# Altium footprint library CMR_Miscellaneous_Devices.PcbLib: 103 footprints (part 5 of 7)
Each footprint in its own frame and in the unit in brackets; x right, y up, seen from the top. Pads: shape width x height; smd on the part's side, far side on the other; paste and mask are expansions set on the pad; w line width, h text height; cw(c..) or ccw(c..) is an arc to the next point about the centre after c.
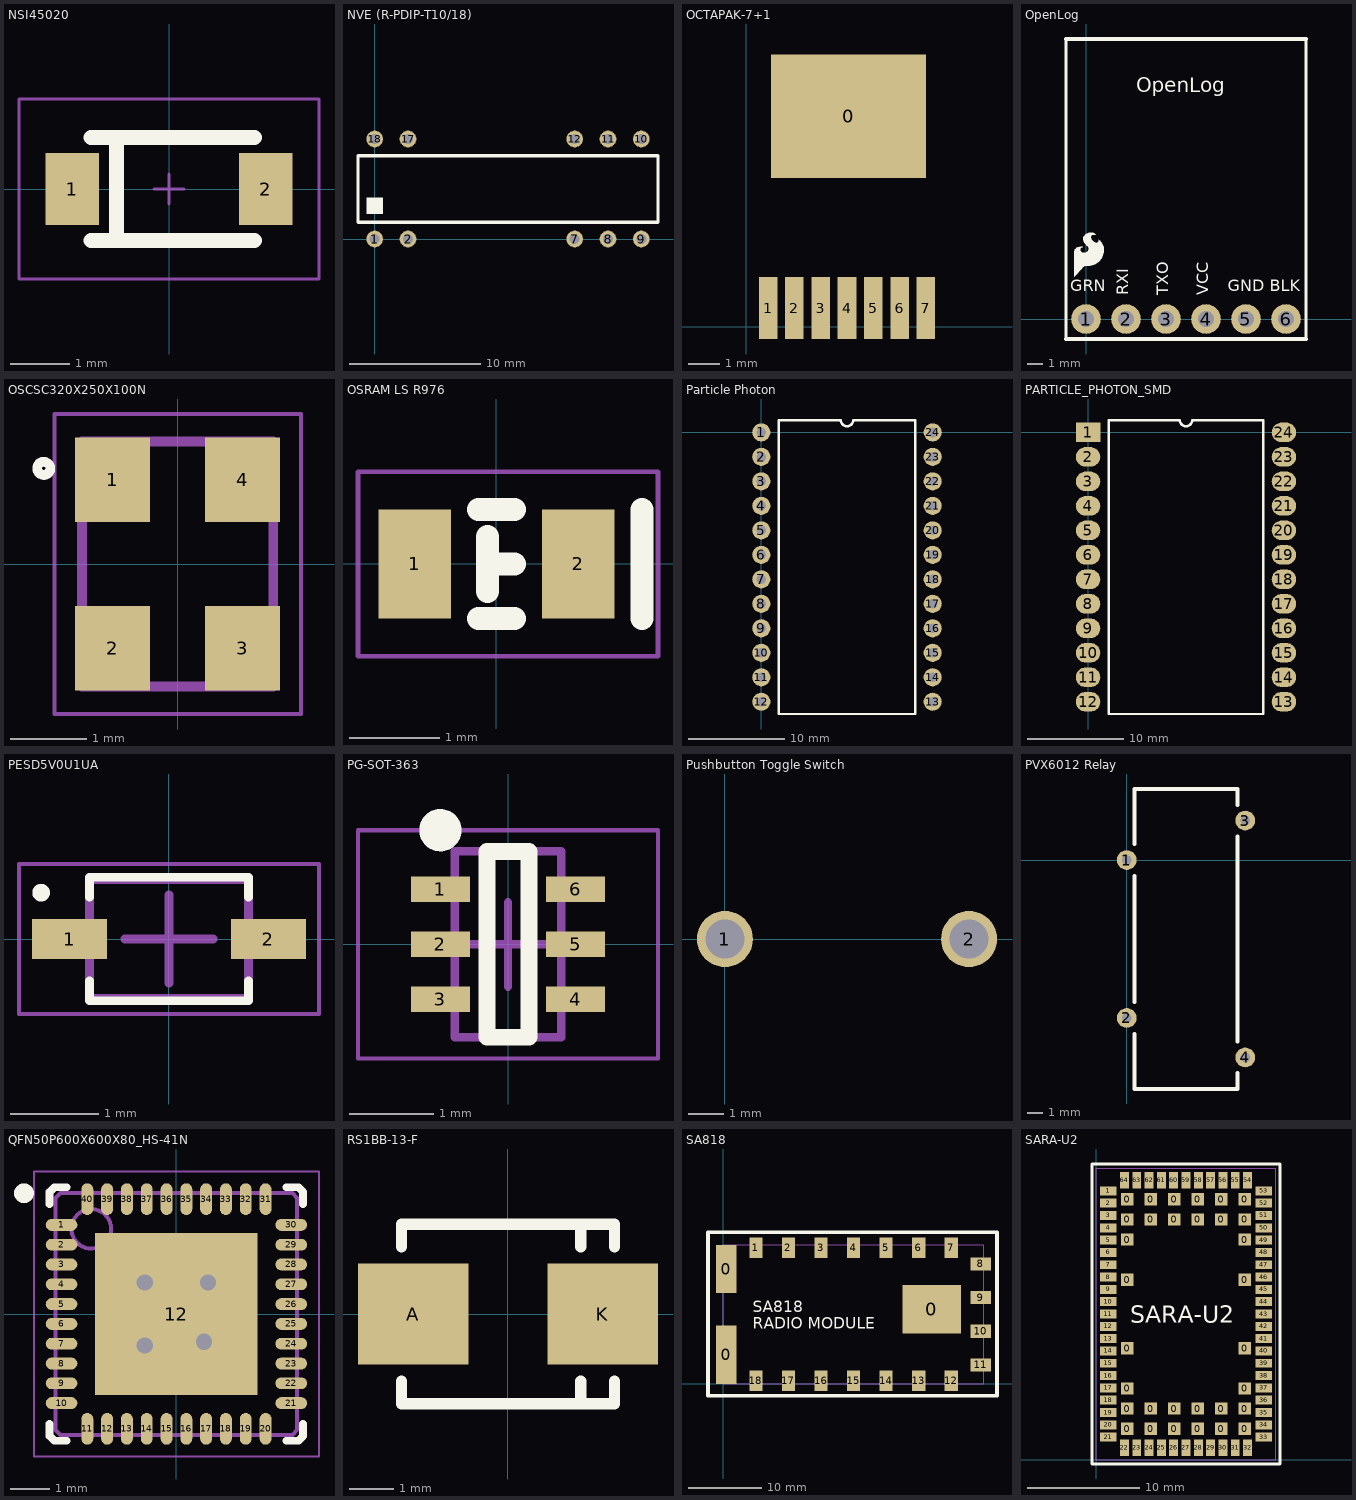
[diagram p4: the footprints below, top view; thin cyan lines are the x and y axes]

## NSI45020 [mm] "SOD-123 Package Constant Current Regulator, 20mA"
pads (2):
  rect 0.91x1.22 smd: 1(-1.637,0) 2(1.637,0)
Top Overlay:
  lines w0.254: -1.325,-0.875 1.45,-0.875 ; -1.325,0.875 1.45,0.875 ; -0.889,-0.875 -0.889,0.875
Mechanical 15:
  lines w0.051: -0.25,0 0.25,0 ; 0,-0.25 0,0.25 ; -2.54,-1.524 0.254,-1.524 2.54,-1.524 2.54,1.524 -2.54,1.524 -2.54,-1.524
3D body "SW3DPS-SOD123-DEFAULT.STEP": height 1.3, standoff 0.03, extent -1.85,-0.8 1.85,0.8

## NVE (R-PDIP-T10/18) [mil]
pads (10):
  round 50 hole 30: 1(0,0) 2(100,0) 7(600,0) 8(700,0) 9(800,0) 10(800,300) 11(700,300) 12(600,300) 17(100,300) 18(0,300)
Top Overlay:
  rectangle: -25,75 25,125
  lines w10: -50,50 850,50 850,250 625,250 175,250 -50,250 -50,125 -50,50

## OCTAPAK-7+1 [mm]
pads (8):
  rect 5x4 smd: 0(3.3,6.8)
  rect 0.6x2 smd: 1(0.7,0.6) 2(1.55,0.6) 3(2.4,0.6) 4(3.25,0.6) 5(4.1,0.6) 6(4.95,0.6) 7(5.8,0.6)
3D body: height 0.25, standoff 0, extent 5.55,0 6.05,2.8
3D body: height 0.25, standoff 0, extent 4.7,0 5.2,2.8
3D body: height 0.25, standoff 0, extent 3.85,0 4.35,2.8
3D body: height 0.25, standoff 0, extent 3,0 3.5,2.8
3D body: height 0.25, standoff 0, extent 2.15,0 2.65,2.8
3D body: height 0.25, standoff 0, extent 1.3,0 1.8,2.8
3D body: height 0.25, standoff 0, extent 0.45,0 0.95,2.8
3D body: height 0.25, standoff 0, extent 0,2.8 6.5,9.7

## OpenLog [mil] "Openlog serial data logger"
pads (6):
  round 74 hole 40: 1(0,0) 2(100,0) 3(200,0) 4(300,0) 5(400,0) 6(500,0)
Top Overlay:
  drawing of 5 lines, arcs and shapes, not listed
  text "OpenLog" at 125,555 h62
  text "GRN" at -40,60 h49.6
  text "TXO" at 215,60 h49.6
  text "RXI" at 115,60 h49.6
  text "VCC" at 315,60 h49.6
  text "GND" at 355,60 h49.6
  text "BLK" at 460,60 h49.6
3D body "Pin Header 1x4 TH Pitch 2.54mm.stp": height 373.85, standoff -125.98, extent 150,-50 550,50
3D body "Pin Header 1x4 TH Pitch 2.54mm.stp": height 373.85, standoff -125.98, extent -50,-50 350,50
3D body "OpenLog.step": height 175, standoff 112.39, extent -50,-50 550,700

## OSCSC320X250X100N [mm]
pads (4):
  rect 0.98x1.1 smd: 1(-0.85,1.1) 2(-0.85,-1.1) 3(0.85,-1.1) 4(0.85,1.1)
Top Overlay:
  circle w0.127: c-1.75,1.25 r0.086
Mechanical 1:
  lines w0.127: -1.25,-1.6 1.25,-1.6 1.25,1.6 -1.25,1.6 -1.25,-1.6
Mechanical 4:
  lines w0.05: -1.61,-1.96 1.61,-1.96 1.61,1.96 -1.61,1.96 -1.61,-1.96
3D body "ABM8G.STEP": height 0.99, standoff 0, extent -1.245,-1.6 1.245,1.6

## OSRAM LS R976 [mm] "OSRAM CHIPLED 0805 RED"
pads (2):
  rect 0.8x1.2 smd: 1(-0.9,0) 2(0.9,0)
Top Overlay:
  lines w0.254: -0.2,-0.6 0.2,-0.6 ; -0.2,0.6 0.2,0.6 ; -0.1,-0.3 -0.1,0.3 ; -0.1,0 0.2,0 ; 1.6,-0.6 1.6,0.6
Mechanical 15:
  lines w0.051: -1.524,-1.016 -1.524,0.254 -1.524,1.016 0.254,1.016 1.778,1.016 1.778,-1.016 0.508,-1.016 -1.524,-1.016
3D body "AP2012.STEP": height 1.09, standoff -0.01, extent -1,-0.625 1,0.625

## Particle Photon [mil]
pads (24):
  round 74 hole 40: 1(0,0) 2(0,-100) 3(0,-200) 4(0,-300) 5(0,-400) 6(0,-500) 7(0,-600) 8(0,-700) 9(0,-800) 10(0,-900) 11(0,-1000) 12(0,-1100) 13(700,-1100) 14(700,-1000) 15(700,-900) 16(700,-800) 17(700,-700) 18(700,-600) 19(700,-500) 20(700,-400) 21(700,-300) 22(700,-200) 23(700,-100) 24(700,0)
Top Overlay:
  lines w10: 72,-1150 628,-1150 628,50 375,50 cw(c350,50) 325,50 72,50 72,-1150
3D body "Particle Photon.stp": height 328.74, standoff -192.46, extent -59.04,-1271.62 740.98,211.39

## PARTICLE_PHOTON_SMD [mil]
pads (24):
  rect 100x80 smd: 1(0,0)
  oval 100x80 smd: 2(0,-100) 3(0,-200) 4(0,-300) 5(0,-400) 6(0,-500) 7(0,-600) 8(0,-700) 9(0,-800) 10(0,-900) 11(0,-1000) 12(0,-1100) 13(800,-1100) 14(800,-1000) 15(800,-900) 16(800,-800) 17(800,-700) 18(800,-600) 19(800,-500) 20(800,-400) 21(800,-300) 22(800,-200) 23(800,-100) 24(800,0)
Top Overlay:
  lines w10: 85,-1150 85,50 375,50 ccw(c400,50) 425,50 715,50 715,-1150 85,-1150

## PESD5V0U1UA [mm] "SODFL, 2-Leads, Body 1.25x2.50mm, IPC Medium Density"
height 1.1
pads (2):
  rect 0.85x0.45 smd: 1(-1.125,0) 2(1.125,0)
Top Overlay:
  circle w0.1: c-1.45,0.525 r0.05
  lines w0.1: -0.9,-0.475 -0.9,-0.7 0.9,-0.7 0.9,-0.475 ; -0.9,0.475 -0.9,0.7 0.9,0.7 0.9,0.475
Mechanical 13:
  lines w0.1: -0.9,-0.675 -0.9,0.675 0.9,0.675 0.9,-0.675 -0.9,-0.675
Mechanical 15:
  lines w0.05: -1.7,-0.85 -1.7,0.85 1.7,0.85 1.7,-0.85 -1.7,-0.85
  lines w0.1: -0.5,0 0.5,0 ; 0,-0.5 0,0.5
3D body "PESD5V0U1UA.step": height 1.1, standoff 0, extent -1.25,-0.675 1.25,0.675

## PG-SOT-363 [mm] "SOT23, 6-Leads, Body 2.00x2.15mm, Pitch 0.65mm, IPC Medium Density"
height 1
pads (6):
  rect 0.7x0.3 smd: 1(-0.8,0.65) 2(-0.8,0) 3(-0.8,-0.65) 4(0.8,-0.65) 5(0.8,0) 6(0.8,0.65)
Top Overlay:
  circle w0.25: c-0.8,1.35 r0.125
  lines w0.2: -0.25,-1.1 0.25,-1.1 0.25,1.1 -0.25,1.1 -0.25,-1.1
Mechanical 13:
  lines w0.1: -0.63,-1.1 -0.63,1.1 0.63,1.1 0.63,-1.1 -0.63,-1.1
Mechanical 15:
  lines w0.05: -1.775,-1.35 -1.775,1.35 1.775,1.35 1.775,-1.35 -1.775,-1.35
  lines w0.1: -0.5,0 0.5,0 ; 0,-0.5 0,0.5
3D body: height 1, standoff 0.1, extent -0.63,-1.1 0.63,1.1

## Pushbutton Toggle Switch [mm] "On-Off Power Button / Pushbutton Toggle Switch:1683"
pads (2):
  round 1.56 hole 1.1: 1(0,0) 2(6.8,0)

## PVX6012 Relay [mm] "PVS6012 Relay"
pads (4):
  round 1.27 hole 0.635: 1(0,0) 2(0,-10.16) 3(7.62,2.54) 4(7.62,-12.7)
Top Overlay:
  lines w0.254: 0.508,-11.176 0.508,-14.732 7.112,-14.732 7.112,-13.716 ; 0.508,-9.144 0.508,-1.016 ; 0.508,1.016 0.508,4.572 7.112,4.572 7.112,3.556 ; 7.112,-11.684 7.112,1.524
3D body: height 3.3, standoff 0.38, extent 0.508,-14.732 7.112,4.572

## QFN50P600X600X80_HS-41N [mm] "QFN, 40-Leads, Body 6.00x6.00mm, Pitch 0.50mm, Thermal Pad 4.10x4.10mm, IPC Medium Density"
height 0.8
pads (41):
  oval 0.8x0.3 smd mask+0.06: 1(-2.9,2.25) 2(-2.9,1.75) 3(-2.9,1.25) 4(-2.9,0.75) 5(-2.9,0.25) 6(-2.9,-0.25) 7(-2.9,-0.75) 8(-2.9,-1.25) 9(-2.9,-1.75) 10(-2.9,-2.25) 21(2.9,-2.25) 22(2.9,-1.75) 23(2.9,-1.25) 24(2.9,-0.75) 25(2.9,-0.25) 26(2.9,0.25) 27(2.9,0.75) 28(2.9,1.25) 29(2.9,1.75) 30(2.9,2.25)
  oval 0.3x0.8 smd mask+0.06: 11(-2.25,-2.9) 12(-1.75,-2.9) 13(-1.25,-2.9) 14(-0.75,-2.9) 15(-0.25,-2.9) 16(0.25,-2.9) 17(0.75,-2.9) 18(1.25,-2.9) 19(1.75,-2.9) 20(2.25,-2.9) 31(2.25,2.9) 32(1.75,2.9) 33(1.25,2.9) 34(0.75,2.9) 35(0.25,2.9) 36(-0.25,2.9) 37(-0.75,2.9) 38(-1.25,2.9) 39(-1.75,2.9) 40(-2.25,2.9)
  rect 4.1x4.1 smd: 12(0,0)
via -0.8,0.8 diameter 0.813 hole 0.406
via 0.8,0.8 diameter 0.813 hole 0.406
via -0.8,-0.8 diameter 0.813 hole 0.406
via 0.7,-0.7 diameter 0.813 hole 0.406
Top Overlay:
  circle w0.25: c-3.85,3.05 r0.125
  lines w0.2: -3.2,-2.775 -3.2,-3.08 -3.08,-3.2 -2.775,-3.2 ; -3.2,2.775 -3.2,3.08 -3.08,3.2 -2.775,3.2 ; 2.775,-3.2 3.08,-3.2 3.2,-3.08 3.2,-2.775 ; 2.775,3.2 3.08,3.2 3.2,3.08 3.2,2.775
Mechanical 13:
  circle w0.1: c-2.15,2.15 r0.5
  lines w0.1: -3.05,-2.93 -2.93,-3.05 2.93,-3.05 3.05,-2.93 3.05,2.93 2.93,3.05 -2.93,3.05 -3.05,2.93 -3.05,-2.93
Mechanical 15:
  lines w0.05: -3.6,-3.6 -3.6,3.6 3.6,3.6 3.6,-3.6 -3.6,-3.6
  lines w0.1: -0.5,0 0.5,0 ; 0,-0.5 0,0.5
3D body: height 0.8, standoff 0.05, extent -3.05,-3.05 3.05,3.05

## RS1BB-13-F [mm]
pads (2):
  rect 2.5x2.3 smd: A(-2.15,0) K(2.15,0)
Top Overlay:
  lines w0.254: -2.413,-1.524 -2.413,-2.032 2.413,-2.032 2.413,-1.524 ; -2.413,1.524 -2.413,2.032 2.413,2.032 2.413,1.524 ; 1.651,-2.032 1.651,-1.524 ; 1.651,1.524 1.651,2.032
3D body "User Library-DO-214AA(SMB).step": height 2.67, standoff 0.03, extent -2.794,-2.032 2.794,1.918

## SA818 [mm]
pads (21):
  rect 2.8x6.6 smd: 0(0.4,15.7)
  rect 2.8x8 smd: 0(0.4,4)
  rect 8x6.6 smd: 0(28.5,10.2)
  rect 1.8x2.8 smd: 1(4.45,18.6) 2(8.9,18.6) 3(13.35,18.6) 4(17.8,18.6) 5(22.25,18.6) 6(26.7,18.6) 7(31.15,18.6) 12(31.15,0.4) 13(26.7,0.4) 14(22.25,0.4) 15(17.8,0.4) 16(13.35,0.4) 17(8.9,0.4) 18(4.45,0.4)
  rect 2.8x1.8 smd: 8(35.2,16.4) 9(35.2,11.8) 10(35.2,7.2) 11(35.2,2.6)
Top Overlay:
  lines w0.5: -2.1,-1.6 -2.1,20.7 37.4,20.7 37.4,-1.6 -2.1,-1.6
  text "SA818 / RADIO MODULE" at 4,7.5 h1.52
  text "." at 4.3,15.6 h2
Mechanical 13:
  lines w0.025: 0,0 0,19 35.6,19 35.6,0 0,0
3D body: height 3, standoff 0, extent 0.001,0.001 35.599,18.999

## SARA-U2 [mm] "Cellular Module"
pads (96):
  rect 1.1x1.1 smd: 0(2.75,2.75) 0(2.75,4.55) 0(2.75,6.35) 0(2.75,9.95) 0(2.75,16.05) 0(2.75,19.65) 0(2.75,21.45) 0(2.75,23.25) 0(4.85,2.75) 0(4.85,4.55) 0(4.85,21.45) 0(4.85,23.25) 0(6.95,2.75) 0(6.95,4.55) 0(6.95,21.45) 0(6.95,23.25) 0(9.05,2.75) 0(9.05,4.55) 0(9.05,21.45) 0(9.05,23.25) 0(11.15,2.75) 0(11.15,4.55) 0(11.15,21.45) 0(11.15,23.25) 0(13.25,2.75) 0(13.25,4.55) 0(13.25,6.35) 0(13.25,9.95) 0(13.25,16.05) 0(13.25,19.65) 0(13.25,21.45) 0(13.25,23.25)
  rect 1.5x0.8 smd: 1(1.05,24) 2(1.05,22.9) 3(1.05,21.8) 4(1.05,20.7) 5(1.05,19.6) 6(1.05,18.5) 7(1.05,17.4) 8(1.05,16.3) 9(1.05,15.2) 10(1.05,14.1) 11(1.05,13) 12(1.05,11.9) 13(1.05,10.8) 14(1.05,9.7) 15(1.05,8.6) 16(1.05,7.5) 17(1.05,6.4) 18(1.05,5.3) 19(1.05,4.2) 20(1.05,3.1) 21(1.05,2) 33(14.95,2) 34(14.95,3.1) 35(14.95,4.2) 36(14.95,5.3) 37(14.95,6.4) 38(14.95,7.5) 39(14.95,8.6) 40(14.95,9.7) 41(14.95,10.8) 42(14.95,11.9) 43(14.95,13) 44(14.95,14.1) 45(14.95,15.2) 46(14.95,16.3) 47(14.95,17.4) 48(14.95,18.5) 49(14.95,19.6) 50(14.95,20.7) 51(14.95,21.8) 52(14.95,22.9) 53(14.95,24)
  rect 0.8x1.5 smd: 22(2.5,1.05) 23(3.6,1.05) 24(4.7,1.05) 25(5.8,1.05) 26(6.9,1.05) 27(8,1.05) 28(9.1,1.05) 29(10.2,1.05) 30(11.3,1.05) 31(12.4,1.05) 32(13.5,1.05) 54(13.5,24.95) 55(12.4,24.95) 56(11.3,24.95) 57(10.2,24.95) 58(9.1,24.95) 59(8,24.95) 60(6.9,24.95) 61(5.8,24.95) 62(4.7,24.95) 63(3.6,24.95) 64(2.5,24.95)
Top Overlay:
  lines w0.25: -0.4,-0.4 -0.4,26.4 16.4,26.4 16.4,-0.4 -0.4,-0.4
  text "SARA-U2" at 3,12.2 h1.52
  text "." at 0.8,25.1 h2
Mechanical 13:
  lines w0.025: 0,0 16,0 16,26 0,26 0,0
3D body: height 3, standoff 0, extent 0.001,0.001 15.999,25.999